# Altium integrated library WCAP-ATG8_rev15a.intlib: 195 symbols (part 2 of 2) (continued)
## WCAP-ATG8 16x25x7.5x0.8 860010780022
designator C?, comment 680 μF
WCAP-ATG8 Aluminum Electrolytic Capacitors , 680 μF; + / - 20%; 63 V , 16 x 25; Manufacturer: Wurth Elektronik; partNo: 860010780022; E-mail: libraries@we-online.com; Characteristics: Aluminum Electrolytic Capacitor; Recommended soldering: Wave; Operating temperature:–40 °C to +85 °C for UR < 400 V; 25 °C to +85 °C for UR ≥ 400 V; Wide capacitance value range; Load life: 2000 h @ +85 °C; ComponentLink1Description: Manufacturer; ComponentLink1URL: http://www.we-online.com; ComponentLink2Description: Datasheet; ComponentLink2URL: http://katalog.we-online.de/pbs/datasheet/860010780022.pdf; Created by: Karrer Zheng; Created Date: 6/8/2015; Capacitance: 680 μF; Application: Medium and high voltage type range from 160V-450V used as primary side input filter in power supply; Low voltage type used as energy storage or low frequency filtering in circuit, applied to general switching power supply, AC-DC converter, adapter, charger, TV, VCR, DC motor circuit filter, digital audio, digital cameras, digital video cameras, satellite receiver etc.
footprint WCAP-ATG8 16x25x7.5x0.8
pins: 1, 2

## WCAP-ATG8 16x25x7.5x0.8 860010780023
designator C?, comment 820 μF
WCAP-ATG8 Aluminum Electrolytic Capacitors , 820 μF; + / - 20%; 63 V , 16 x 25; Manufacturer: Wurth Elektronik; partNo: 860010780023; E-mail: libraries@we-online.com; Characteristics: Aluminum Electrolytic Capacitor; Recommended soldering: Wave; Operating temperature:–40 °C to +85 °C for UR < 400 V; 25 °C to +85 °C for UR ≥ 400 V; Wide capacitance value range; Load life: 2000 h @ +85 °C; ComponentLink1Description: Manufacturer; ComponentLink1URL: http://www.we-online.com; ComponentLink2Description: Datasheet; ComponentLink2URL: http://katalog.we-online.de/pbs/datasheet/860010780023.pdf; Created by: Karrer Zheng; Created Date: 6/8/2015; Capacitance: 820 μF; Application: Medium and high voltage type range from 160V-450V used as primary side input filter in power supply; Low voltage type used as energy storage or low frequency filtering in circuit, applied to general switching power supply, AC-DC converter, adapter, charger, TV, VCR, DC motor circuit filter, digital audio, digital cameras, digital video cameras, satellite receiver etc.
footprint WCAP-ATG8 16x25x7.5x0.8
pins: 1, 2

## WCAP-ATG8 16x25x7.5x0.8 860010780024
designator C?, comment 1000 μF
WCAP-ATG8 Aluminum Electrolytic Capacitors , 1000 μF; + / - 20%; 63 V , 16 x 25; Manufacturer: Wurth Elektronik; partNo: 860010780024; E-mail: libraries@we-online.com; Characteristics: Aluminum Electrolytic Capacitor; Recommended soldering: Wave; Operating temperature:–40 °C to +85 °C for UR < 400 V; 25 °C to +85 °C for UR ≥ 400 V; Wide capacitance value range; Load life: 2000 h @ +85 °C; ComponentLink1Description: Manufacturer; ComponentLink1URL: http://www.we-online.com; ComponentLink2Description: Datasheet; ComponentLink2URL: http://katalog.we-online.de/pbs/datasheet/860010780024.pdf; Created by: Karrer Zheng; Created Date: 6/8/2015; Capacitance: 1000 μF; Application: Medium and high voltage type range from 160V-450V used as primary side input filter in power supply; Low voltage type used as energy storage or low frequency filtering in circuit, applied to general switching power supply, AC-DC converter, adapter, charger, TV, VCR, DC motor circuit filter, digital audio, digital cameras, digital video cameras, satellite receiver etc.
footprint WCAP-ATG8 16x25x7.5x0.8
pins: 1, 2

## WCAP-ATG8 16x31.5x7.5x0.8 860010780025
designator C?, comment 1200 μF
WCAP-ATG8 Aluminum Electrolytic Capacitors , 1200 μF; + / - 20%; 63 V , 16 x 31,5; Manufacturer: Wurth Elektronik; partNo: 860010780025; E-mail: libraries@we-online.com; Characteristics: Aluminum Electrolytic Capacitor; Recommended soldering: Wave; Operating temperature:–40 °C to +85 °C for UR < 400 V; 25 °C to +85 °C for UR ≥ 400 V; Wide capacitance value range; Load life: 2000 h @ +85 °C; ComponentLink1Description: Manufacturer; ComponentLink1URL: http://www.we-online.com; ComponentLink2Description: Datasheet; ComponentLink2URL: http://katalog.we-online.de/pbs/datasheet/860010780025.pdf; Created by: Karrer Zheng; Created Date: 6/8/2015; Capacitance: 1200 μF; Application: Medium and high voltage type range from 160V-450V used as primary side input filter in power supply; Low voltage type used as energy storage or low frequency filtering in circuit, applied to general switching power supply, AC-DC converter, adapter, charger, TV, VCR, DC motor circuit filter, digital audio, digital cameras, digital video cameras, satellite receiver etc.
footprint WCAP-ATG8 16x31.5x7.5x0.8
pins: 1, 2

## WCAP-ATG8 16x35.5x7.5x0.8 860010780026
designator C?, comment 1500 μF
WCAP-ATG8 Aluminum Electrolytic Capacitors , 1500 μF; + / - 20%; 63 V , 16 x 35,5; Manufacturer: Wurth Elektronik; partNo: 860010780026; E-mail: libraries@we-online.com; Characteristics: Aluminum Electrolytic Capacitor; Recommended soldering: Wave; Operating temperature:–40 °C to +85 °C for UR < 400 V; 25 °C to +85 °C for UR ≥ 400 V; Wide capacitance value range; Load life: 2000 h @ +85 °C; ComponentLink1Description: Manufacturer; ComponentLink1URL: http://www.we-online.com; ComponentLink2Description: Datasheet; ComponentLink2URL: http://katalog.we-online.de/pbs/datasheet/860010780026.pdf; Created by: Karrer Zheng; Created Date: 6/8/2015; Capacitance: 1500 μF; Application: Medium and high voltage type range from 160V-450V used as primary side input filter in power supply; Low voltage type used as energy storage or low frequency filtering in circuit, applied to general switching power supply, AC-DC converter, adapter, charger, TV, VCR, DC motor circuit filter, digital audio, digital cameras, digital video cameras, satellite receiver etc.
footprint WCAP-ATG8 16x35.5x7.5x0.8
pins: 1, 2

## WCAP-ATG8 16x35.5x7.5x0.8 860010780027
designator C?, comment 1800 μF
WCAP-ATG8 Aluminum Electrolytic Capacitors , 1800 μF; + / - 20%; 63 V , 16 x 35,5; Manufacturer: Wurth Elektronik; partNo: 860010780027; E-mail: libraries@we-online.com; Characteristics: Aluminum Electrolytic Capacitor; Recommended soldering: Wave; Operating temperature:–40 °C to +85 °C for UR < 400 V; 25 °C to +85 °C for UR ≥ 400 V; Wide capacitance value range; Load life: 2000 h @ +85 °C; ComponentLink1Description: Manufacturer; ComponentLink1URL: http://www.we-online.com; ComponentLink2Description: Datasheet; ComponentLink2URL: http://katalog.we-online.de/pbs/datasheet/860010780027.pdf; Created by: Karrer Zheng; Created Date: 6/8/2015; Capacitance: 1800 μF; Application: Medium and high voltage type range from 160V-450V used as primary side input filter in power supply; Low voltage type used as energy storage or low frequency filtering in circuit, applied to general switching power supply, AC-DC converter, adapter, charger, TV, VCR, DC motor circuit filter, digital audio, digital cameras, digital video cameras, satellite receiver etc.
footprint WCAP-ATG8 16x35.5x7.5x0.8
pins: 1, 2

## WCAP-ATG8 18x35.5x7.5x0.8 860010781028
designator C?, comment 2200 μF
WCAP-ATG8 Aluminum Electrolytic Capacitors , 2200 μF; + / - 20%; 63 V , 18 x 35,5; Manufacturer: Wurth Elektronik; partNo: 860010781028; E-mail: libraries@we-online.com; Characteristics: Aluminum Electrolytic Capacitor; Recommended soldering: Wave; Operating temperature:–40 °C to +85 °C for UR < 400 V; 25 °C to +85 °C for UR ≥ 400 V; Wide capacitance value range; Load life: 2000 h @ +85 °C; ComponentLink1Description: Manufacturer; ComponentLink1URL: http://www.we-online.com; ComponentLink2Description: Datasheet; ComponentLink2URL: http://katalog.we-online.de/pbs/datasheet/860010781028.pdf; Created by: Karrer Zheng; Created Date: 6/8/2015; Capacitance: 2200 μF; Application: Medium and high voltage type range from 160V-450V used as primary side input filter in power supply; Low voltage type used as energy storage or low frequency filtering in circuit, applied to general switching power supply, AC-DC converter, adapter, charger, TV, VCR, DC motor circuit filter, digital audio, digital cameras, digital video cameras, satellite receiver etc.
footprint WCAP-ATG8 18x35.5x7.5x0.8
pins: 1, 2

## WCAP-ATG8 22x41x10x0.8 860010783029
designator C?, comment 2700 μF
WCAP-ATG8 Aluminum Electrolytic Capacitors , 2700 μF; + / - 20%; 63 V , 22 x 41; Manufacturer: Wurth Elektronik; partNo: 860010783029; E-mail: libraries@we-online.com; Characteristics: Aluminum Electrolytic Capacitor; Recommended soldering: Wave; Operating temperature:–40 °C to +85 °C for UR < 400 V; 25 °C to +85 °C for UR ≥ 400 V; Wide capacitance value range; Load life: 2000 h @ +85 °C; ComponentLink1Description: Manufacturer; ComponentLink1URL: http://www.we-online.com; ComponentLink2Description: Datasheet; ComponentLink2URL: http://katalog.we-online.de/pbs/datasheet/860010783029.pdf; Created by: Karrer Zheng; Created Date: 6/8/2015; Capacitance: 2700 μF; Application: Medium and high voltage type range from 160V-450V used as primary side input filter in power supply; Low voltage type used as energy storage or low frequency filtering in circuit, applied to general switching power supply, AC-DC converter, adapter, charger, TV, VCR, DC motor circuit filter, digital audio, digital cameras, digital video cameras, satellite receiver etc.
footprint WCAP-ATG8 22x41x10x0.8
pins: 1, 2

## WCAP-ATG8 22x41x10x0.8 860010783030
designator C?, comment 3300 μF
WCAP-ATG8 Aluminum Electrolytic Capacitors , 3300 μF; + / - 20%; 63 V , 22 x 41; Manufacturer: Wurth Elektronik; partNo: 860010783030; E-mail: libraries@we-online.com; Characteristics: Aluminum Electrolytic Capacitor; Recommended soldering: Wave; Operating temperature:–40 °C to +85 °C for UR < 400 V; 25 °C to +85 °C for UR ≥ 400 V; Wide capacitance value range; Load life: 2000 h @ +85 °C; ComponentLink1Description: Manufacturer; ComponentLink1URL: http://www.we-online.com; ComponentLink2Description: Datasheet; ComponentLink2URL: http://katalog.we-online.de/pbs/datasheet/860010783030.pdf; Created by: Karrer Zheng; Created Date: 6/8/2015; Capacitance: 3300 μF; Application: Medium and high voltage type range from 160V-450V used as primary side input filter in power supply; Low voltage type used as energy storage or low frequency filtering in circuit, applied to general switching power supply, AC-DC converter, adapter, charger, TV, VCR, DC motor circuit filter, digital audio, digital cameras, digital video cameras, satellite receiver etc.
footprint WCAP-ATG8 22x41x10x0.8
pins: 1, 2


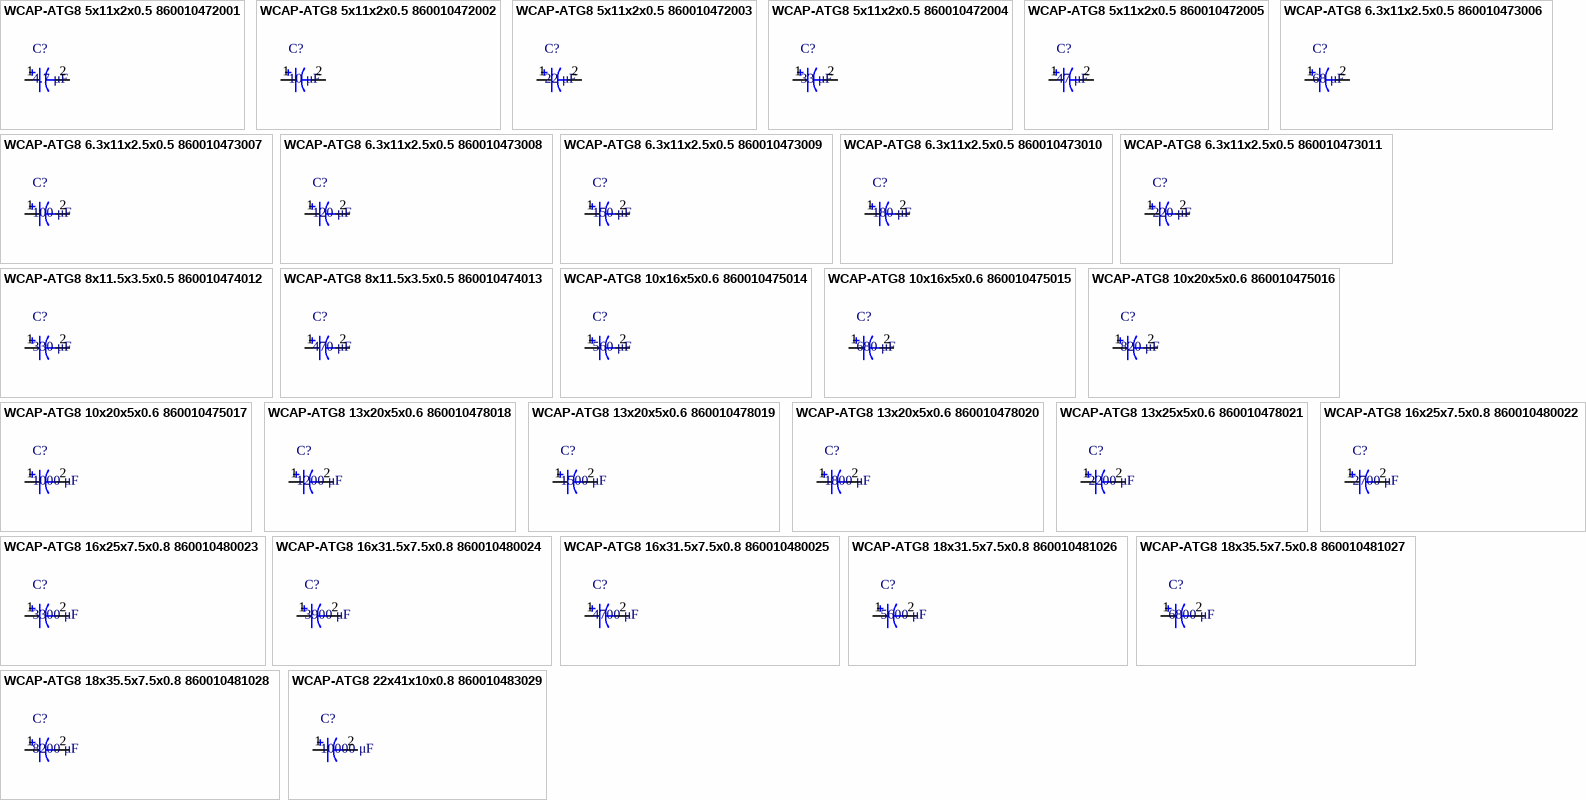
[diagram p5: symbols WCAP-ATG8 5x11x2x0.5 860010472001 to WCAP-ATG8 22x41x10x0.8 860010483029]

## WCAP-ATG8 5x11x2x0.5 860010472001
designator C?, comment 4.7 μF
WCAP-ATG8 Aluminum Electrolytic Capacitors , 4,7 μF; + / - 20%; 25 V , 5 x 11; Manufacturer: Wurth Elektronik; partNo: 860010472001; E-mail: libraries@we-online.com; Characteristics: Aluminum Electrolytic Capacitor; Recommended soldering: Wave; Operating temperature:–40 °C to +85 °C for UR < 400 V; 25 °C to +85 °C for UR ≥ 400 V; Wide capacitance value range; Load life: 2000 h @ +85 °C; ComponentLink1Description: Manufacturer; ComponentLink1URL: http://www.we-online.com; ComponentLink2Description: Datasheet; ComponentLink2URL: http://katalog.we-online.de/pbs/datasheet/860010472001.pdf; Created by: Karrer Zheng; Created Date: 6/8/2015; Capacitance: 4.7 μF; Application: Medium and high voltage type range from 160V-450V used as primary side input filter in power supply; Low voltage type used as energy storage or low frequency filtering in circuit, applied to general switching power supply, AC-DC converter, adapter, charger, TV, VCR, DC motor circuit filter, digital audio, digital cameras, digital video cameras, satellite receiver etc.
footprint WCAP-ATG8 5x11x2x0.5
pins: 1, 2

## WCAP-ATG8 5x11x2x0.5 860010472002
designator C?, comment 10 μF
WCAP-ATG8 Aluminum Electrolytic Capacitors , 10 μF; + / - 20%; 25 V , 5 x 11; Manufacturer: Wurth Elektronik; partNo: 860010472002; E-mail: libraries@we-online.com; Characteristics: Aluminum Electrolytic Capacitor; Recommended soldering: Wave; Operating temperature:–40 °C to +85 °C for UR < 400 V; 25 °C to +85 °C for UR ≥ 400 V; Wide capacitance value range; Load life: 2000 h @ +85 °C; ComponentLink1Description: Manufacturer; ComponentLink1URL: http://www.we-online.com; ComponentLink2Description: Datasheet; ComponentLink2URL: http://katalog.we-online.de/pbs/datasheet/860010472002.pdf; Created by: Karrer Zheng; Created Date: 6/8/2015; Capacitance: 10 μF; Application: Medium and high voltage type range from 160V-450V used as primary side input filter in power supply; Low voltage type used as energy storage or low frequency filtering in circuit, applied to general switching power supply, AC-DC converter, adapter, charger, TV, VCR, DC motor circuit filter, digital audio, digital cameras, digital video cameras, satellite receiver etc.
footprint WCAP-ATG8 5x11x2x0.5
pins: 1, 2

## WCAP-ATG8 5x11x2x0.5 860010472003
designator C?, comment 22 μF
WCAP-ATG8 Aluminum Electrolytic Capacitors , 22 μF; + / - 20%; 25 V , 5 x 11; Manufacturer: Wurth Elektronik; partNo: 860010472003; E-mail: libraries@we-online.com; Characteristics: Aluminum Electrolytic Capacitor; Recommended soldering: Wave; Operating temperature:–40 °C to +85 °C for UR < 400 V; 25 °C to +85 °C for UR ≥ 400 V; Wide capacitance value range; Load life: 2000 h @ +85 °C; ComponentLink1Description: Manufacturer; ComponentLink1URL: http://www.we-online.com; ComponentLink2Description: Datasheet; ComponentLink2URL: http://katalog.we-online.de/pbs/datasheet/860010472003.pdf; Created by: Karrer Zheng; Created Date: 6/8/2015; Capacitance: 22 μF; Application: Medium and high voltage type range from 160V-450V used as primary side input filter in power supply; Low voltage type used as energy storage or low frequency filtering in circuit, applied to general switching power supply, AC-DC converter, adapter, charger, TV, VCR, DC motor circuit filter, digital audio, digital cameras, digital video cameras, satellite receiver etc.
footprint WCAP-ATG8 5x11x2x0.5
pins: 1, 2

## WCAP-ATG8 5x11x2x0.5 860010472004
designator C?, comment 33 μF
WCAP-ATG8 Aluminum Electrolytic Capacitors , 33 μF; + / - 20%; 25 V , 5 x 11; Manufacturer: Wurth Elektronik; partNo: 860010472004; E-mail: libraries@we-online.com; Characteristics: Aluminum Electrolytic Capacitor; Recommended soldering: Wave; Operating temperature:–40 °C to +85 °C for UR < 400 V; 25 °C to +85 °C for UR ≥ 400 V; Wide capacitance value range; Load life: 2000 h @ +85 °C; ComponentLink1Description: Manufacturer; ComponentLink1URL: http://www.we-online.com; ComponentLink2Description: Datasheet; ComponentLink2URL: http://katalog.we-online.de/pbs/datasheet/860010472004.pdf; Created by: Karrer Zheng; Created Date: 6/8/2015; Capacitance: 33 μF; Application: Medium and high voltage type range from 160V-450V used as primary side input filter in power supply; Low voltage type used as energy storage or low frequency filtering in circuit, applied to general switching power supply, AC-DC converter, adapter, charger, TV, VCR, DC motor circuit filter, digital audio, digital cameras, digital video cameras, satellite receiver etc.
footprint WCAP-ATG8 5x11x2x0.5
pins: 1, 2

## WCAP-ATG8 5x11x2x0.5 860010472005
designator C?, comment 47 μF
WCAP-ATG8 Aluminum Electrolytic Capacitors , 47 μF; + / - 20%; 25 V , 5 x 11; Manufacturer: Wurth Elektronik; partNo: 860010472005; E-mail: libraries@we-online.com; Characteristics: Aluminum Electrolytic Capacitor; Recommended soldering: Wave; Operating temperature:–40 °C to +85 °C for UR < 400 V; 25 °C to +85 °C for UR ≥ 400 V; Wide capacitance value range; Load life: 2000 h @ +85 °C; ComponentLink1Description: Manufacturer; ComponentLink1URL: http://www.we-online.com; ComponentLink2Description: Datasheet; ComponentLink2URL: http://katalog.we-online.de/pbs/datasheet/860010472005.pdf; Created by: Karrer Zheng; Created Date: 6/8/2015; Capacitance: 47 μF; Application: Medium and high voltage type range from 160V-450V used as primary side input filter in power supply; Low voltage type used as energy storage or low frequency filtering in circuit, applied to general switching power supply, AC-DC converter, adapter, charger, TV, VCR, DC motor circuit filter, digital audio, digital cameras, digital video cameras, satellite receiver etc.
footprint WCAP-ATG8 5x11x2x0.5
pins: 1, 2

## WCAP-ATG8 6.3x11x2.5x0.5 860010473006
designator C?, comment 68 μF
WCAP-ATG8 Aluminum Electrolytic Capacitors , 68 μF; + / - 20%; 25 V , 6,3 x 11; Manufacturer: Wurth Elektronik; partNo: 860010473006; E-mail: libraries@we-online.com; Characteristics: Aluminum Electrolytic Capacitor; Recommended soldering: Wave; Operating temperature:–40 °C to +85 °C for UR < 400 V; 25 °C to +85 °C for UR ≥ 400 V; Wide capacitance value range; Load life: 2000 h @ +85 °C; ComponentLink1Description: Manufacturer; ComponentLink1URL: http://www.we-online.com; ComponentLink2Description: Datasheet; ComponentLink2URL: http://katalog.we-online.de/pbs/datasheet/860010473006.pdf; Created by: Karrer Zheng; Created Date: 6/8/2015; Capacitance: 68 μF; Application: Medium and high voltage type range from 160V-450V used as primary side input filter in power supply; Low voltage type used as energy storage or low frequency filtering in circuit, applied to general switching power supply, AC-DC converter, adapter, charger, TV, VCR, DC motor circuit filter, digital audio, digital cameras, digital video cameras, satellite receiver etc.
footprint WCAP-ATG8 6.3x11x2.5x0.5
pins: 1, 2

## WCAP-ATG8 6.3x11x2.5x0.5 860010473007
designator C?, comment 100 μF
WCAP-ATG8 Aluminum Electrolytic Capacitors , 100 μF; + / - 20%; 25 V , 6,3 x 11; Manufacturer: Wurth Elektronik; partNo: 860010473007; E-mail: libraries@we-online.com; Characteristics: Aluminum Electrolytic Capacitor; Recommended soldering: Wave; Operating temperature:–40 °C to +85 °C for UR < 400 V; 25 °C to +85 °C for UR ≥ 400 V; Wide capacitance value range; Load life: 2000 h @ +85 °C; ComponentLink1Description: Manufacturer; ComponentLink1URL: http://www.we-online.com; ComponentLink2Description: Datasheet; ComponentLink2URL: http://katalog.we-online.de/pbs/datasheet/860010473007.pdf; Created by: Karrer Zheng; Created Date: 6/8/2015; Capacitance: 100 μF; Application: Medium and high voltage type range from 160V-450V used as primary side input filter in power supply; Low voltage type used as energy storage or low frequency filtering in circuit, applied to general switching power supply, AC-DC converter, adapter, charger, TV, VCR, DC motor circuit filter, digital audio, digital cameras, digital video cameras, satellite receiver etc.
footprint WCAP-ATG8 6.3x11x2.5x0.5
pins: 1, 2

## WCAP-ATG8 6.3x11x2.5x0.5 860010473008
designator C?, comment 120 μF
WCAP-ATG8 Aluminum Electrolytic Capacitors , 120 μF; + / - 20%; 25 V , 6,3 x 11; Manufacturer: Wurth Elektronik; partNo: 860010473008; E-mail: libraries@we-online.com; Characteristics: Aluminum Electrolytic Capacitor; Recommended soldering: Wave; Operating temperature:–40 °C to +85 °C for UR < 400 V; 25 °C to +85 °C for UR ≥ 400 V; Wide capacitance value range; Load life: 2000 h @ +85 °C; ComponentLink1Description: Manufacturer; ComponentLink1URL: http://www.we-online.com; ComponentLink2Description: Datasheet; ComponentLink2URL: http://katalog.we-online.de/pbs/datasheet/860010473008.pdf; Created by: Karrer Zheng; Created Date: 6/8/2015; Capacitance: 120 μF; Application: Medium and high voltage type range from 160V-450V used as primary side input filter in power supply; Low voltage type used as energy storage or low frequency filtering in circuit, applied to general switching power supply, AC-DC converter, adapter, charger, TV, VCR, DC motor circuit filter, digital audio, digital cameras, digital video cameras, satellite receiver etc.
footprint WCAP-ATG8 6.3x11x2.5x0.5
pins: 1, 2

## WCAP-ATG8 6.3x11x2.5x0.5 860010473009
designator C?, comment 150 μF
WCAP-ATG8 Aluminum Electrolytic Capacitors , 150 μF; + / - 20%; 25 V , 6,3 x 11; Manufacturer: Wurth Elektronik; partNo: 860010473009; E-mail: libraries@we-online.com; Characteristics: Aluminum Electrolytic Capacitor; Recommended soldering: Wave; Operating temperature:–40 °C to +85 °C for UR < 400 V; 25 °C to +85 °C for UR ≥ 400 V; Wide capacitance value range; Load life: 2000 h @ +85 °C; ComponentLink1Description: Manufacturer; ComponentLink1URL: http://www.we-online.com; ComponentLink2Description: Datasheet; ComponentLink2URL: http://katalog.we-online.de/pbs/datasheet/860010473009.pdf; Created by: Karrer Zheng; Created Date: 6/8/2015; Capacitance: 150 μF; Application: Medium and high voltage type range from 160V-450V used as primary side input filter in power supply; Low voltage type used as energy storage or low frequency filtering in circuit, applied to general switching power supply, AC-DC converter, adapter, charger, TV, VCR, DC motor circuit filter, digital audio, digital cameras, digital video cameras, satellite receiver etc.
footprint WCAP-ATG8 6.3x11x2.5x0.5
pins: 1, 2

## WCAP-ATG8 6.3x11x2.5x0.5 860010473010
designator C?, comment 180 μF
WCAP-ATG8 Aluminum Electrolytic Capacitors , 180 μF; + / - 20%; 25 V , 6,3 x 11; Manufacturer: Wurth Elektronik; partNo: 860010473010; E-mail: libraries@we-online.com; Characteristics: Aluminum Electrolytic Capacitor; Recommended soldering: Wave; Operating temperature:–40 °C to +85 °C for UR < 400 V; 25 °C to +85 °C for UR ≥ 400 V; Wide capacitance value range; Load life: 2000 h @ +85 °C; ComponentLink1Description: Manufacturer; ComponentLink1URL: http://www.we-online.com; ComponentLink2Description: Datasheet; ComponentLink2URL: http://katalog.we-online.de/pbs/datasheet/860010473010.pdf; Created by: Karrer Zheng; Created Date: 6/8/2015; Capacitance: 180 μF; Application: Medium and high voltage type range from 160V-450V used as primary side input filter in power supply; Low voltage type used as energy storage or low frequency filtering in circuit, applied to general switching power supply, AC-DC converter, adapter, charger, TV, VCR, DC motor circuit filter, digital audio, digital cameras, digital video cameras, satellite receiver etc.
footprint WCAP-ATG8 6.3x11x2.5x0.5
pins: 1, 2

## WCAP-ATG8 6.3x11x2.5x0.5 860010473011
designator C?, comment 220 μF
WCAP-ATG8 Aluminum Electrolytic Capacitors , 220 μF; + / - 20%; 25 V , 6,3 x 11; Manufacturer: Wurth Elektronik; partNo: 860010473011; E-mail: libraries@we-online.com; Characteristics: Aluminum Electrolytic Capacitor; Recommended soldering: Wave; Operating temperature:–40 °C to +85 °C for UR < 400 V; 25 °C to +85 °C for UR ≥ 400 V; Wide capacitance value range; Load life: 2000 h @ +85 °C; ComponentLink1Description: Manufacturer; ComponentLink1URL: http://www.we-online.com; ComponentLink2Description: Datasheet; ComponentLink2URL: http://katalog.we-online.de/pbs/datasheet/860010473011.pdf; Created by: Karrer Zheng; Created Date: 6/8/2015; Capacitance: 220 μF; Application: Medium and high voltage type range from 160V-450V used as primary side input filter in power supply; Low voltage type used as energy storage or low frequency filtering in circuit, applied to general switching power supply, AC-DC converter, adapter, charger, TV, VCR, DC motor circuit filter, digital audio, digital cameras, digital video cameras, satellite receiver etc.
footprint WCAP-ATG8 6.3x11x2.5x0.5
pins: 1, 2

## WCAP-ATG8 8x11.5x3.5x0.5 860010474012
designator C?, comment 330 μF
WCAP-ATG8 Aluminum Electrolytic Capacitors , 330 μF; + / - 20%; 25 V , 8 x 11,5; Manufacturer: Wurth Elektronik; partNo: 860010474012; E-mail: libraries@we-online.com; Characteristics: Aluminum Electrolytic Capacitor; Recommended soldering: Wave; Operating temperature:–40 °C to +85 °C for UR < 400 V; 25 °C to +85 °C for UR ≥ 400 V; Wide capacitance value range; Load life: 2000 h @ +85 °C; ComponentLink1Description: Manufacturer; ComponentLink1URL: http://www.we-online.com; ComponentLink2Description: Datasheet; ComponentLink2URL: http://katalog.we-online.de/pbs/datasheet/860010474012.pdf; Created by: Karrer Zheng; Created Date: 6/8/2015; Capacitance: 330 μF; Application: Medium and high voltage type range from 160V-450V used as primary side input filter in power supply; Low voltage type used as energy storage or low frequency filtering in circuit, applied to general switching power supply, AC-DC converter, adapter, charger, TV, VCR, DC motor circuit filter, digital audio, digital cameras, digital video cameras, satellite receiver etc.
footprint WCAP-ATG8 8x11.5x3.5x0.5
pins: 1, 2

## WCAP-ATG8 8x11.5x3.5x0.5 860010474013
designator C?, comment 470 μF
WCAP-ATG8 Aluminum Electrolytic Capacitors , 470 μF; + / - 20%; 25 V , 8 x 11,5; Manufacturer: Wurth Elektronik; partNo: 860010474013; E-mail: libraries@we-online.com; Characteristics: Aluminum Electrolytic Capacitor; Recommended soldering: Wave; Operating temperature:–40 °C to +85 °C for UR < 400 V; 25 °C to +85 °C for UR ≥ 400 V; Wide capacitance value range; Load life: 2000 h @ +85 °C; ComponentLink1Description: Manufacturer; ComponentLink1URL: http://www.we-online.com; ComponentLink2Description: Datasheet; ComponentLink2URL: http://katalog.we-online.de/pbs/datasheet/860010474013.pdf; Created by: Karrer Zheng; Created Date: 6/8/2015; Capacitance: 470 μF; Application: Medium and high voltage type range from 160V-450V used as primary side input filter in power supply; Low voltage type used as energy storage or low frequency filtering in circuit, applied to general switching power supply, AC-DC converter, adapter, charger, TV, VCR, DC motor circuit filter, digital audio, digital cameras, digital video cameras, satellite receiver etc.
footprint WCAP-ATG8 8x11.5x3.5x0.5
pins: 1, 2

## WCAP-ATG8 10x16x5x0.6 860010475014
designator C?, comment 560 μF
WCAP-ATG8 Aluminum Electrolytic Capacitors , 560 μF; + / - 20%; 25 V , 10 x 16; Manufacturer: Wurth Elektronik; partNo: 860010475014; E-mail: libraries@we-online.com; Characteristics: Aluminum Electrolytic Capacitor; Recommended soldering: Wave; Operating temperature:–40 °C to +85 °C for UR < 400 V; 25 °C to +85 °C for UR ≥ 400 V; Wide capacitance value range; Load life: 2000 h @ +85 °C; ComponentLink1Description: Manufacturer; ComponentLink1URL: http://www.we-online.com; ComponentLink2Description: Datasheet; ComponentLink2URL: http://katalog.we-online.de/pbs/datasheet/860010475014.pdf; Created by: Karrer Zheng; Created Date: 6/8/2015; Capacitance: 560 μF; Application: Medium and high voltage type range from 160V-450V used as primary side input filter in power supply; Low voltage type used as energy storage or low frequency filtering in circuit, applied to general switching power supply, AC-DC converter, adapter, charger, TV, VCR, DC motor circuit filter, digital audio, digital cameras, digital video cameras, satellite receiver etc.
footprint WCAP-ATG8 10x16x5x0.6
pins: 1, 2

## WCAP-ATG8 10x16x5x0.6 860010475015
designator C?, comment 680 μF
WCAP-ATG8 Aluminum Electrolytic Capacitors , 680 μF; + / - 20%; 25 V , 10 x 16; Manufacturer: Wurth Elektronik; partNo: 860010475015; E-mail: libraries@we-online.com; Characteristics: Aluminum Electrolytic Capacitor; Recommended soldering: Wave; Operating temperature:–40 °C to +85 °C for UR < 400 V; 25 °C to +85 °C for UR ≥ 400 V; Wide capacitance value range; Load life: 2000 h @ +85 °C; ComponentLink1Description: Manufacturer; ComponentLink1URL: http://www.we-online.com; ComponentLink2Description: Datasheet; ComponentLink2URL: http://katalog.we-online.de/pbs/datasheet/860010475015.pdf; Created by: Karrer Zheng; Created Date: 6/8/2015; Capacitance: 680 μF; Application: Medium and high voltage type range from 160V-450V used as primary side input filter in power supply; Low voltage type used as energy storage or low frequency filtering in circuit, applied to general switching power supply, AC-DC converter, adapter, charger, TV, VCR, DC motor circuit filter, digital audio, digital cameras, digital video cameras, satellite receiver etc.
footprint WCAP-ATG8 10x16x5x0.6
pins: 1, 2

## WCAP-ATG8 10x20x5x0.6 860010475016
designator C?, comment 820 μF
WCAP-ATG8 Aluminum Electrolytic Capacitors , 820 μF; + / - 20%; 25 V , 10 x 20; Manufacturer: Wurth Elektronik; partNo: 860010475016; E-mail: libraries@we-online.com; Characteristics: Aluminum Electrolytic Capacitor; Recommended soldering: Wave; Operating temperature:–40 °C to +85 °C for UR < 400 V; 25 °C to +85 °C for UR ≥ 400 V; Wide capacitance value range; Load life: 2000 h @ +85 °C; ComponentLink1Description: Manufacturer; ComponentLink1URL: http://www.we-online.com; ComponentLink2Description: Datasheet; ComponentLink2URL: http://katalog.we-online.de/pbs/datasheet/860010475016.pdf; Created by: Karrer Zheng; Created Date: 6/8/2015; Capacitance: 820 μF; Application: Medium and high voltage type range from 160V-450V used as primary side input filter in power supply; Low voltage type used as energy storage or low frequency filtering in circuit, applied to general switching power supply, AC-DC converter, adapter, charger, TV, VCR, DC motor circuit filter, digital audio, digital cameras, digital video cameras, satellite receiver etc.
footprint WCAP-ATG8 10x20x5x0.6
pins: 1, 2

## WCAP-ATG8 10x20x5x0.6 860010475017
designator C?, comment 1000 μF
WCAP-ATG8 Aluminum Electrolytic Capacitors , 1000 μF; + / - 20%; 25 V , 10 x 20; Manufacturer: Wurth Elektronik; partNo: 860010475017; E-mail: libraries@we-online.com; Characteristics: Aluminum Electrolytic Capacitor; Recommended soldering: Wave; Operating temperature:–40 °C to +85 °C for UR < 400 V; 25 °C to +85 °C for UR ≥ 400 V; Wide capacitance value range; Load life: 2000 h @ +85 °C; ComponentLink1Description: Manufacturer; ComponentLink1URL: http://www.we-online.com; ComponentLink2Description: Datasheet; ComponentLink2URL: http://katalog.we-online.de/pbs/datasheet/860010475017.pdf; Created by: Karrer Zheng; Created Date: 6/8/2015; Capacitance: 1000 μF; Application: Medium and high voltage type range from 160V-450V used as primary side input filter in power supply; Low voltage type used as energy storage or low frequency filtering in circuit, applied to general switching power supply, AC-DC converter, adapter, charger, TV, VCR, DC motor circuit filter, digital audio, digital cameras, digital video cameras, satellite receiver etc.
footprint WCAP-ATG8 10x20x5x0.6
pins: 1, 2

## WCAP-ATG8 13x20x5x0.6 860010478018
designator C?, comment 1200 μF
WCAP-ATG8 Aluminum Electrolytic Capacitors , 1200 μF; + / - 20%; 25 V , 13 x 20; Manufacturer: Wurth Elektronik; partNo: 860010478018; E-mail: libraries@we-online.com; Characteristics: Aluminum Electrolytic Capacitor; Recommended soldering: Wave; Operating temperature:–40 °C to +85 °C for UR < 400 V; 25 °C to +85 °C for UR ≥ 400 V; Wide capacitance value range; Load life: 2000 h @ +85 °C; ComponentLink1Description: Manufacturer; ComponentLink1URL: http://www.we-online.com; ComponentLink2Description: Datasheet; ComponentLink2URL: http://katalog.we-online.de/pbs/datasheet/860010478018.pdf; Created by: Karrer Zheng; Created Date: 6/8/2015; Capacitance: 1200 μF; Application: Medium and high voltage type range from 160V-450V used as primary side input filter in power supply; Low voltage type used as energy storage or low frequency filtering in circuit, applied to general switching power supply, AC-DC converter, adapter, charger, TV, VCR, DC motor circuit filter, digital audio, digital cameras, digital video cameras, satellite receiver etc.
footprint WCAP-ATG8 13x20x5x0.6
pins: 1, 2

## WCAP-ATG8 13x20x5x0.6 860010478019
designator C?, comment 1500 μF
WCAP-ATG8 Aluminum Electrolytic Capacitors , 1500 μF; + / - 20%; 25 V , 13 x 20; Manufacturer: Wurth Elektronik; partNo: 860010478019; E-mail: libraries@we-online.com; Characteristics: Aluminum Electrolytic Capacitor; Recommended soldering: Wave; Operating temperature:–40 °C to +85 °C for UR < 400 V; 25 °C to +85 °C for UR ≥ 400 V; Wide capacitance value range; Load life: 2000 h @ +85 °C; ComponentLink1Description: Manufacturer; ComponentLink1URL: http://www.we-online.com; ComponentLink2Description: Datasheet; ComponentLink2URL: http://katalog.we-online.de/pbs/datasheet/860010478019.pdf; Created by: Karrer Zheng; Created Date: 6/8/2015; Capacitance: 1500 μF; Application: Medium and high voltage type range from 160V-450V used as primary side input filter in power supply; Low voltage type used as energy storage or low frequency filtering in circuit, applied to general switching power supply, AC-DC converter, adapter, charger, TV, VCR, DC motor circuit filter, digital audio, digital cameras, digital video cameras, satellite receiver etc.
footprint WCAP-ATG8 13x20x5x0.6
pins: 1, 2

## WCAP-ATG8 13x20x5x0.6 860010478020
designator C?, comment 1800 μF
WCAP-ATG8 Aluminum Electrolytic Capacitors , 1800 μF; + / - 20%; 25 V , 13 x 20; Manufacturer: Wurth Elektronik; partNo: 860010478020; E-mail: libraries@we-online.com; Characteristics: Aluminum Electrolytic Capacitor; Recommended soldering: Wave; Operating temperature:–40 °C to +85 °C for UR < 400 V; 25 °C to +85 °C for UR ≥ 400 V; Wide capacitance value range; Load life: 2000 h @ +85 °C; ComponentLink1Description: Manufacturer; ComponentLink1URL: http://www.we-online.com; ComponentLink2Description: Datasheet; ComponentLink2URL: http://katalog.we-online.de/pbs/datasheet/860010478020.pdf; Created by: Karrer Zheng; Created Date: 6/8/2015; Capacitance: 1800 μF; Application: Medium and high voltage type range from 160V-450V used as primary side input filter in power supply; Low voltage type used as energy storage or low frequency filtering in circuit, applied to general switching power supply, AC-DC converter, adapter, charger, TV, VCR, DC motor circuit filter, digital audio, digital cameras, digital video cameras, satellite receiver etc.
footprint WCAP-ATG8 13x20x5x0.6
pins: 1, 2

## WCAP-ATG8 13x25x5x0.6 860010478021
designator C?, comment 2200 μF
WCAP-ATG8 Aluminum Electrolytic Capacitors , 2200 μF; + / - 20%; 25 V , 13 x 25; Manufacturer: Wurth Elektronik; partNo: 860010478021; E-mail: libraries@we-online.com; Characteristics: Aluminum Electrolytic Capacitor; Recommended soldering: Wave; Operating temperature:–40 °C to +85 °C for UR < 400 V; 25 °C to +85 °C for UR ≥ 400 V; Wide capacitance value range; Load life: 2000 h @ +85 °C; ComponentLink1Description: Manufacturer; ComponentLink1URL: http://www.we-online.com; ComponentLink2Description: Datasheet; ComponentLink2URL: http://katalog.we-online.de/pbs/datasheet/860010478021.pdf; Created by: Karrer Zheng; Created Date: 6/8/2015; Capacitance: 2200 μF; Application: Medium and high voltage type range from 160V-450V used as primary side input filter in power supply; Low voltage type used as energy storage or low frequency filtering in circuit, applied to general switching power supply, AC-DC converter, adapter, charger, TV, VCR, DC motor circuit filter, digital audio, digital cameras, digital video cameras, satellite receiver etc.
footprint WCAP-ATG8 13x25x5x0.6
pins: 1, 2

## WCAP-ATG8 16x25x7.5x0.8 860010480022
designator C?, comment 2700 μF
WCAP-ATG8 Aluminum Electrolytic Capacitors , 2700 μF; + / - 20%; 25 V , 16 x 25; Manufacturer: Wurth Elektronik; partNo: 860010480022; E-mail: libraries@we-online.com; Characteristics: Aluminum Electrolytic Capacitor; Recommended soldering: Wave; Operating temperature:–40 °C to +85 °C for UR < 400 V; 25 °C to +85 °C for UR ≥ 400 V; Wide capacitance value range; Load life: 2000 h @ +85 °C; ComponentLink1Description: Manufacturer; ComponentLink1URL: http://www.we-online.com; ComponentLink2Description: Datasheet; ComponentLink2URL: http://katalog.we-online.de/pbs/datasheet/860010480022.pdf; Created by: Karrer Zheng; Created Date: 6/8/2015; Capacitance: 2700 μF; Application: Medium and high voltage type range from 160V-450V used as primary side input filter in power supply; Low voltage type used as energy storage or low frequency filtering in circuit, applied to general switching power supply, AC-DC converter, adapter, charger, TV, VCR, DC motor circuit filter, digital audio, digital cameras, digital video cameras, satellite receiver etc.
footprint WCAP-ATG8 16x25x7.5x0.8
pins: 1, 2

## WCAP-ATG8 16x25x7.5x0.8 860010480023
designator C?, comment 3300 μF
WCAP-ATG8 Aluminum Electrolytic Capacitors , 3300 μF; + / - 20%; 25 V , 16 x 25; Manufacturer: Wurth Elektronik; partNo: 860010480023; E-mail: libraries@we-online.com; Characteristics: Aluminum Electrolytic Capacitor; Recommended soldering: Wave; Operating temperature:–40 °C to +85 °C for UR < 400 V; 25 °C to +85 °C for UR ≥ 400 V; Wide capacitance value range; Load life: 2000 h @ +85 °C; ComponentLink1Description: Manufacturer; ComponentLink1URL: http://www.we-online.com; ComponentLink2Description: Datasheet; ComponentLink2URL: http://katalog.we-online.de/pbs/datasheet/860010480023.pdf; Created by: Karrer Zheng; Created Date: 6/8/2015; Capacitance: 3300 μF; Application: Medium and high voltage type range from 160V-450V used as primary side input filter in power supply; Low voltage type used as energy storage or low frequency filtering in circuit, applied to general switching power supply, AC-DC converter, adapter, charger, TV, VCR, DC motor circuit filter, digital audio, digital cameras, digital video cameras, satellite receiver etc.
footprint WCAP-ATG8 16x25x7.5x0.8
pins: 1, 2

## WCAP-ATG8 16x31.5x7.5x0.8 860010480024
designator C?, comment 3900 μF
WCAP-ATG8 Aluminum Electrolytic Capacitors , 3900 μF; + / - 20%; 25 V , 16 x 31,5; Manufacturer: Wurth Elektronik; partNo: 860010480024; E-mail: libraries@we-online.com; Characteristics: Aluminum Electrolytic Capacitor; Recommended soldering: Wave; Operating temperature:–40 °C to +85 °C for UR < 400 V; 25 °C to +85 °C for UR ≥ 400 V; Wide capacitance value range; Load life: 2000 h @ +85 °C; ComponentLink1Description: Manufacturer; ComponentLink1URL: http://www.we-online.com; ComponentLink2Description: Datasheet; ComponentLink2URL: http://katalog.we-online.de/pbs/datasheet/860010480024.pdf; Created by: Karrer Zheng; Created Date: 6/8/2015; Capacitance: 3900 μF; Application: Medium and high voltage type range from 160V-450V used as primary side input filter in power supply; Low voltage type used as energy storage or low frequency filtering in circuit, applied to general switching power supply, AC-DC converter, adapter, charger, TV, VCR, DC motor circuit filter, digital audio, digital cameras, digital video cameras, satellite receiver etc.
footprint WCAP-ATG8 16x31.5x7.5x0.8
pins: 1, 2

## WCAP-ATG8 16x31.5x7.5x0.8 860010480025
designator C?, comment 4700 μF
WCAP-ATG8 Aluminum Electrolytic Capacitors , 4700 μF; + / - 20%; 25 V , 16 x 31,5; Manufacturer: Wurth Elektronik; partNo: 860010480025; E-mail: libraries@we-online.com; Characteristics: Aluminum Electrolytic Capacitor; Recommended soldering: Wave; Operating temperature:–40 °C to +85 °C for UR < 400 V; 25 °C to +85 °C for UR ≥ 400 V; Wide capacitance value range; Load life: 2000 h @ +85 °C; ComponentLink1Description: Manufacturer; ComponentLink1URL: http://www.we-online.com; ComponentLink2Description: Datasheet; ComponentLink2URL: http://katalog.we-online.de/pbs/datasheet/860010480025.pdf; Created by: Karrer Zheng; Created Date: 6/8/2015; Capacitance: 4700 μF; Application: Medium and high voltage type range from 160V-450V used as primary side input filter in power supply; Low voltage type used as energy storage or low frequency filtering in circuit, applied to general switching power supply, AC-DC converter, adapter, charger, TV, VCR, DC motor circuit filter, digital audio, digital cameras, digital video cameras, satellite receiver etc.
footprint WCAP-ATG8 16x31.5x7.5x0.8
pins: 1, 2

## WCAP-ATG8 18x31.5x7.5x0.8 860010481026
designator C?, comment 5600 μF
WCAP-ATG8 Aluminum Electrolytic Capacitors , 5600 μF; + / - 20%; 25 V , 18 x 31,5; Manufacturer: Wurth Elektronik; partNo: 860010481026; E-mail: libraries@we-online.com; Characteristics: Aluminum Electrolytic Capacitor; Recommended soldering: Wave; Operating temperature:–40 °C to +85 °C for UR < 400 V; 25 °C to +85 °C for UR ≥ 400 V; Wide capacitance value range; Load life: 2000 h @ +85 °C; ComponentLink1Description: Manufacturer; ComponentLink1URL: http://www.we-online.com; ComponentLink2Description: Datasheet; ComponentLink2URL: http://katalog.we-online.de/pbs/datasheet/860010481026.pdf; Created by: Karrer Zheng; Created Date: 6/8/2015; Capacitance: 5600 μF; Application: Medium and high voltage type range from 160V-450V used as primary side input filter in power supply; Low voltage type used as energy storage or low frequency filtering in circuit, applied to general switching power supply, AC-DC converter, adapter, charger, TV, VCR, DC motor circuit filter, digital audio, digital cameras, digital video cameras, satellite receiver etc.
footprint WCAP-ATG8 18x31.5x7.5x0.8
pins: 1, 2

## WCAP-ATG8 18x35.5x7.5x0.8 860010481027
designator C?, comment 6800 μF
WCAP-ATG8 Aluminum Electrolytic Capacitors , 6800 μF; + / - 20%; 25 V , 18 x 35,5; Manufacturer: Wurth Elektronik; partNo: 860010481027; E-mail: libraries@we-online.com; Characteristics: Aluminum Electrolytic Capacitor; Recommended soldering: Wave; Operating temperature:–40 °C to +85 °C for UR < 400 V; 25 °C to +85 °C for UR ≥ 400 V; Wide capacitance value range; Load life: 2000 h @ +85 °C; ComponentLink1Description: Manufacturer; ComponentLink1URL: http://www.we-online.com; ComponentLink2Description: Datasheet; ComponentLink2URL: http://katalog.we-online.de/pbs/datasheet/860010481027.pdf; Created by: Karrer Zheng; Created Date: 6/8/2015; Capacitance: 6800 μF; Application: Medium and high voltage type range from 160V-450V used as primary side input filter in power supply; Low voltage type used as energy storage or low frequency filtering in circuit, applied to general switching power supply, AC-DC converter, adapter, charger, TV, VCR, DC motor circuit filter, digital audio, digital cameras, digital video cameras, satellite receiver etc.
footprint WCAP-ATG8 18x35.5x7.5x0.8
pins: 1, 2

## WCAP-ATG8 18x35.5x7.5x0.8 860010481028
designator C?, comment 8200 μF
WCAP-ATG8 Aluminum Electrolytic Capacitors , 8200 μF; + / - 20%; 25 V , 18 x 35,5; Manufacturer: Wurth Elektronik; partNo: 860010481028; E-mail: libraries@we-online.com; Characteristics: Aluminum Electrolytic Capacitor; Recommended soldering: Wave; Operating temperature:–40 °C to +85 °C for UR < 400 V; 25 °C to +85 °C for UR ≥ 400 V; Wide capacitance value range; Load life: 2000 h @ +85 °C; ComponentLink1Description: Manufacturer; ComponentLink1URL: http://www.we-online.com; ComponentLink2Description: Datasheet; ComponentLink2URL: http://katalog.we-online.de/pbs/datasheet/860010481028.pdf; Created by: Karrer Zheng; Created Date: 6/8/2015; Capacitance: 8200 μF; Application: Medium and high voltage type range from 160V-450V used as primary side input filter in power supply; Low voltage type used as energy storage or low frequency filtering in circuit, applied to general switching power supply, AC-DC converter, adapter, charger, TV, VCR, DC motor circuit filter, digital audio, digital cameras, digital video cameras, satellite receiver etc.
footprint WCAP-ATG8 18x35.5x7.5x0.8
pins: 1, 2

## WCAP-ATG8 22x41x10x0.8 860010483029
designator C?, comment 10000 μF
WCAP-ATG8 Aluminum Electrolytic Capacitors , 10000 μF; + / - 20%; 25 V , 22 x 41; Manufacturer: Wurth Elektronik; partNo: 860010483029; E-mail: libraries@we-online.com; Characteristics: Aluminum Electrolytic Capacitor; Recommended soldering: Wave; Operating temperature:–40 °C to +85 °C for UR < 400 V; 25 °C to +85 °C for UR ≥ 400 V; Wide capacitance value range; Load life: 2000 h @ +85 °C; ComponentLink1Description: Manufacturer; ComponentLink1URL: http://www.we-online.com; ComponentLink2Description: Datasheet; ComponentLink2URL: http://katalog.we-online.de/pbs/datasheet/860010483029.pdf; Created by: Karrer Zheng; Created Date: 6/8/2015; Capacitance: 10000 μF; Application: Medium and high voltage type range from 160V-450V used as primary side input filter in power supply; Low voltage type used as energy storage or low frequency filtering in circuit, applied to general switching power supply, AC-DC converter, adapter, charger, TV, VCR, DC motor circuit filter, digital audio, digital cameras, digital video cameras, satellite receiver etc.
footprint WCAP-ATG8 22x41x10x0.8
pins: 1, 2


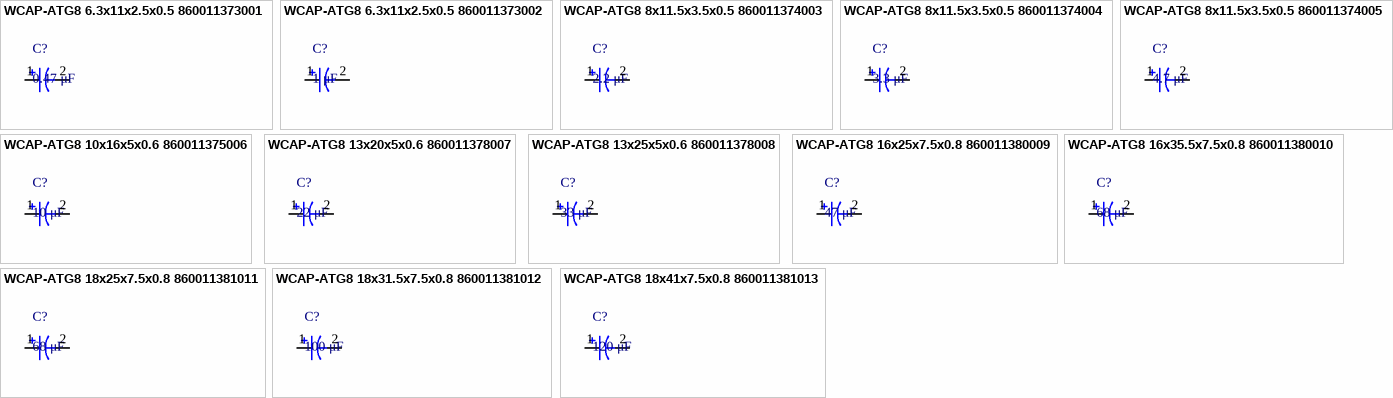
[diagram p6: symbols WCAP-ATG8 6.3x11x2.5x0.5 860011373001 to WCAP-ATG8 18x41x7.5x0.8 860011381013]

## WCAP-ATG8 6.3x11x2.5x0.5 860011373001
designator C?, comment 0.47 μF
WCAP-ATG8 Aluminum Electrolytic Capacitors , 0,47 μF; + / - 20%; 400 V , 6,3 x 11; Manufacturer: Wurth Elektronik; partNo: 860011373001; E-mail: libraries@we-online.com; Characteristics: Aluminum Electrolytic Capacitor; Recommended soldering: Wave; Operating temperature:–40 °C to +85 °C for UR < 400 V; 25 °C to +85 °C for UR ≥ 400 V; Wide capacitance value range; Load life: 2000 h @ +85 °C; ComponentLink1Description: Manufacturer; ComponentLink1URL: http://www.we-online.com; ComponentLink2Description: Datasheet; ComponentLink2URL: http://katalog.we-online.de/pbs/datasheet/860011373001.pdf; Created by: Karrer Zheng; Created Date: 6/8/2015; Capacitance: 0.47 μF; Application: Medium and high voltage type range from 160V-450V used as primary side input filter in power supply; Low voltage type used as energy storage or low frequency filtering in circuit, applied to general switching power supply, AC-DC converter, adapter, charger, TV, VCR, DC motor circuit filter, digital audio, digital cameras, digital video cameras, satellite receiver etc.
footprint WCAP-ATG8 6.3x11x2.5x0.5
pins: 1, 2

## WCAP-ATG8 6.3x11x2.5x0.5 860011373002
designator C?, comment 1 μF
WCAP-ATG8 Aluminum Electrolytic Capacitors , 1 μF; + / - 20%; 400 V , 6,3 x 11; Manufacturer: Wurth Elektronik; partNo: 860011373002; E-mail: libraries@we-online.com; Characteristics: Aluminum Electrolytic Capacitor; Recommended soldering: Wave; Operating temperature:–40 °C to +85 °C for UR < 400 V; 25 °C to +85 °C for UR ≥ 400 V; Wide capacitance value range; Load life: 2000 h @ +85 °C; ComponentLink1Description: Manufacturer; ComponentLink1URL: http://www.we-online.com; ComponentLink2Description: Datasheet; ComponentLink2URL: http://katalog.we-online.de/pbs/datasheet/860011373002.pdf; Created by: Karrer Zheng; Created Date: 6/8/2015; Capacitance: 1 μF; Application: Medium and high voltage type range from 160V-450V used as primary side input filter in power supply; Low voltage type used as energy storage or low frequency filtering in circuit, applied to general switching power supply, AC-DC converter, adapter, charger, TV, VCR, DC motor circuit filter, digital audio, digital cameras, digital video cameras, satellite receiver etc.
footprint WCAP-ATG8 6.3x11x2.5x0.5
pins: 1, 2

## WCAP-ATG8 8x11.5x3.5x0.5 860011374003
designator C?, comment 2.2 μF
WCAP-ATG8 Aluminum Electrolytic Capacitors , 2,2 μF; + / - 20%; 400 V , 8 x 11,5; Manufacturer: Wurth Elektronik; partNo: 860011374003; E-mail: libraries@we-online.com; Characteristics: Aluminum Electrolytic Capacitor; Recommended soldering: Wave; Operating temperature:–40 °C to +85 °C for UR < 400 V; 25 °C to +85 °C for UR ≥ 400 V; Wide capacitance value range; Load life: 2000 h @ +85 °C; ComponentLink1Description: Manufacturer; ComponentLink1URL: http://www.we-online.com; ComponentLink2Description: Datasheet; ComponentLink2URL: http://katalog.we-online.de/pbs/datasheet/860011374003.pdf; Created by: Karrer Zheng; Created Date: 6/8/2015; Capacitance: 2.2 μF; Application: Medium and high voltage type range from 160V-450V used as primary side input filter in power supply; Low voltage type used as energy storage or low frequency filtering in circuit, applied to general switching power supply, AC-DC converter, adapter, charger, TV, VCR, DC motor circuit filter, digital audio, digital cameras, digital video cameras, satellite receiver etc.
footprint WCAP-ATG8 8x11.5x3.5x0.5
pins: 1, 2

## WCAP-ATG8 8x11.5x3.5x0.5 860011374004
designator C?, comment 3.3 μF
WCAP-ATG8 Aluminum Electrolytic Capacitors , 3,3 μF; + / - 20%; 400 V , 8 x 11,5; Manufacturer: Wurth Elektronik; partNo: 860011374004; E-mail: libraries@we-online.com; Characteristics: Aluminum Electrolytic Capacitor; Recommended soldering: Wave; Operating temperature:–40 °C to +85 °C for UR < 400 V; 25 °C to +85 °C for UR ≥ 400 V; Wide capacitance value range; Load life: 2000 h @ +85 °C; ComponentLink1Description: Manufacturer; ComponentLink1URL: http://www.we-online.com; ComponentLink2Description: Datasheet; ComponentLink2URL: http://katalog.we-online.de/pbs/datasheet/860011374004.pdf; Created by: Karrer Zheng; Created Date: 6/8/2015; Capacitance: 3.3 μF; Application: Medium and high voltage type range from 160V-450V used as primary side input filter in power supply; Low voltage type used as energy storage or low frequency filtering in circuit, applied to general switching power supply, AC-DC converter, adapter, charger, TV, VCR, DC motor circuit filter, digital audio, digital cameras, digital video cameras, satellite receiver etc.
footprint WCAP-ATG8 8x11.5x3.5x0.5
pins: 1, 2

## WCAP-ATG8 8x11.5x3.5x0.5 860011374005
designator C?, comment 4.7 μF
WCAP-ATG8 Aluminum Electrolytic Capacitors , 4,7 μF; + / - 20%; 400 V , 8 x 11,5; Manufacturer: Wurth Elektronik; partNo: 860011374005; E-mail: libraries@we-online.com; Characteristics: Aluminum Electrolytic Capacitor; Recommended soldering: Wave; Operating temperature:–40 °C to +85 °C for UR < 400 V; 25 °C to +85 °C for UR ≥ 400 V; Wide capacitance value range; Load life: 2000 h @ +85 °C; ComponentLink1Description: Manufacturer; ComponentLink1URL: http://www.we-online.com; ComponentLink2Description: Datasheet; ComponentLink2URL: http://katalog.we-online.de/pbs/datasheet/860011374005.pdf; Created by: Karrer Zheng; Created Date: 6/8/2015; Capacitance: 4.7 μF; Application: Medium and high voltage type range from 160V-450V used as primary side input filter in power supply; Low voltage type used as energy storage or low frequency filtering in circuit, applied to general switching power supply, AC-DC converter, adapter, charger, TV, VCR, DC motor circuit filter, digital audio, digital cameras, digital video cameras, satellite receiver etc.
footprint WCAP-ATG8 8x11.5x3.5x0.5
pins: 1, 2

## WCAP-ATG8 10x16x5x0.6 860011375006
designator C?, comment 10 μF
WCAP-ATG8 Aluminum Electrolytic Capacitors , 10 μF; + / - 20%; 400 V , 10 x 16; Manufacturer: Wurth Elektronik; partNo: 860011375006; E-mail: libraries@we-online.com; Characteristics: Aluminum Electrolytic Capacitor; Recommended soldering: Wave; Operating temperature:–40 °C to +85 °C for UR < 400 V; 25 °C to +85 °C for UR ≥ 400 V; Wide capacitance value range; Load life: 2000 h @ +85 °C; ComponentLink1Description: Manufacturer; ComponentLink1URL: http://www.we-online.com; ComponentLink2Description: Datasheet; ComponentLink2URL: http://katalog.we-online.de/pbs/datasheet/860011375006.pdf; Created by: Karrer Zheng; Created Date: 6/8/2015; Capacitance: 10 μF; Application: Medium and high voltage type range from 160V-450V used as primary side input filter in power supply; Low voltage type used as energy storage or low frequency filtering in circuit, applied to general switching power supply, AC-DC converter, adapter, charger, TV, VCR, DC motor circuit filter, digital audio, digital cameras, digital video cameras, satellite receiver etc.
footprint WCAP-ATG8 10x16x5x0.6
pins: 1, 2

## WCAP-ATG8 13x20x5x0.6 860011378007
designator C?, comment 22 μF
WCAP-ATG8 Aluminum Electrolytic Capacitors , 22 μF; + / - 20%; 400 V , 13 x 20; Manufacturer: Wurth Elektronik; partNo: 860011378007; E-mail: libraries@we-online.com; Characteristics: Aluminum Electrolytic Capacitor; Recommended soldering: Wave; Operating temperature:–40 °C to +85 °C for UR < 400 V; 25 °C to +85 °C for UR ≥ 400 V; Wide capacitance value range; Load life: 2000 h @ +85 °C; ComponentLink1Description: Manufacturer; ComponentLink1URL: http://www.we-online.com; ComponentLink2Description: Datasheet; ComponentLink2URL: http://katalog.we-online.de/pbs/datasheet/860011378007.pdf; Created by: Karrer Zheng; Created Date: 6/8/2015; Capacitance: 22 μF; Application: Medium and high voltage type range from 160V-450V used as primary side input filter in power supply; Low voltage type used as energy storage or low frequency filtering in circuit, applied to general switching power supply, AC-DC converter, adapter, charger, TV, VCR, DC motor circuit filter, digital audio, digital cameras, digital video cameras, satellite receiver etc.
footprint WCAP-ATG8 13x20x5x0.6
pins: 1, 2

## WCAP-ATG8 13x25x5x0.6 860011378008
designator C?, comment 33 μF
WCAP-ATG8 Aluminum Electrolytic Capacitors , 33 μF; + / - 20%; 400 V , 13 x 25; Manufacturer: Wurth Elektronik; partNo: 860011378008; E-mail: libraries@we-online.com; Characteristics: Aluminum Electrolytic Capacitor; Recommended soldering: Wave; Operating temperature:–40 °C to +85 °C for UR < 400 V; 25 °C to +85 °C for UR ≥ 400 V; Wide capacitance value range; Load life: 2000 h @ +85 °C; ComponentLink1Description: Manufacturer; ComponentLink1URL: http://www.we-online.com; ComponentLink2Description: Datasheet; ComponentLink2URL: http://katalog.we-online.de/pbs/datasheet/860011378008.pdf; Created by: Karrer Zheng; Created Date: 6/8/2015; Capacitance: 33 μF; Application: Medium and high voltage type range from 160V-450V used as primary side input filter in power supply; Low voltage type used as energy storage or low frequency filtering in circuit, applied to general switching power supply, AC-DC converter, adapter, charger, TV, VCR, DC motor circuit filter, digital audio, digital cameras, digital video cameras, satellite receiver etc.
footprint WCAP-ATG8 13x25x5x0.6
pins: 1, 2

## WCAP-ATG8 16x25x7.5x0.8 860011380009
designator C?, comment 47 μF
WCAP-ATG8 Aluminum Electrolytic Capacitors , 47 μF; + / - 20%; 400 V , 16 x 25; Manufacturer: Wurth Elektronik; partNo: 860011380009; E-mail: libraries@we-online.com; Characteristics: Aluminum Electrolytic Capacitor; Recommended soldering: Wave; Operating temperature:–40 °C to +85 °C for UR < 400 V; 25 °C to +85 °C for UR ≥ 400 V; Wide capacitance value range; Load life: 2000 h @ +85 °C; ComponentLink1Description: Manufacturer; ComponentLink1URL: http://www.we-online.com; ComponentLink2Description: Datasheet; ComponentLink2URL: http://katalog.we-online.de/pbs/datasheet/860011380009.pdf; Created by: Karrer Zheng; Created Date: 6/8/2015; Capacitance: 47 μF; Application: Medium and high voltage type range from 160V-450V used as primary side input filter in power supply; Low voltage type used as energy storage or low frequency filtering in circuit, applied to general switching power supply, AC-DC converter, adapter, charger, TV, VCR, DC motor circuit filter, digital audio, digital cameras, digital video cameras, satellite receiver etc.
footprint WCAP-ATG8 16x25x7.5x0.8
pins: 1, 2

## WCAP-ATG8 16x35.5x7.5x0.8 860011380010
designator C?, comment 68 μF
WCAP-ATG8 Aluminum Electrolytic Capacitors , 68 μF; + / - 20%; 400 V , 16 x 35,5; Manufacturer: Wurth Elektronik; partNo: 860011380010; E-mail: libraries@we-online.com; Characteristics: Aluminum Electrolytic Capacitor; Recommended soldering: Wave; Operating temperature:–40 °C to +85 °C for UR < 400 V; 25 °C to +85 °C for UR ≥ 400 V; Wide capacitance value range; Load life: 2000 h @ +85 °C; ComponentLink1Description: Manufacturer; ComponentLink1URL: http://www.we-online.com; ComponentLink2Description: Datasheet; ComponentLink2URL: http://katalog.we-online.de/pbs/datasheet/860011380010.pdf; Created by: Karrer Zheng; Created Date: 6/8/2015; Capacitance: 68 μF; Application: Medium and high voltage type range from 160V-450V used as primary side input filter in power supply; Low voltage type used as energy storage or low frequency filtering in circuit, applied to general switching power supply, AC-DC converter, adapter, charger, TV, VCR, DC motor circuit filter, digital audio, digital cameras, digital video cameras, satellite receiver etc.
footprint WCAP-ATG8 16x35.5x7.5x0.8
pins: 1, 2

## WCAP-ATG8 18x25x7.5x0.8 860011381011
designator C?, comment 68 μF
WCAP-ATG8 Aluminum Electrolytic Capacitors , 68 μF; + / - 20%; 400 V , 18 x 25; Manufacturer: Wurth Elektronik; partNo: 860011381011; E-mail: libraries@we-online.com; Characteristics: Aluminum Electrolytic Capacitor; Recommended soldering: Wave; Operating temperature:–40 °C to +85 °C for UR < 400 V; 25 °C to +85 °C for UR ≥ 400 V; Wide capacitance value range; Load life: 2000 h @ +85 °C; ComponentLink1Description: Manufacturer; ComponentLink1URL: http://www.we-online.com; ComponentLink2Description: Datasheet; ComponentLink2URL: http://katalog.we-online.de/pbs/datasheet/860011381011.pdf; Created by: Karrer Zheng; Created Date: 6/8/2015; Capacitance: 68 μF; Application: Medium and high voltage type range from 160V-450V used as primary side input filter in power supply; Low voltage type used as energy storage or low frequency filtering in circuit, applied to general switching power supply, AC-DC converter, adapter, charger, TV, VCR, DC motor circuit filter, digital audio, digital cameras, digital video cameras, satellite receiver etc.
footprint WCAP-ATG8 18x25x7.5x0.8
pins: 1, 2

## WCAP-ATG8 18x31.5x7.5x0.8 860011381012
designator C?, comment 100 μF
WCAP-ATG8 Aluminum Electrolytic Capacitors , 100 μF; + / - 20%; 400 V , 18 x 31,5; Manufacturer: Wurth Elektronik; partNo: 860011381012; E-mail: libraries@we-online.com; Characteristics: Aluminum Electrolytic Capacitor; Recommended soldering: Wave; Operating temperature:–40 °C to +85 °C for UR < 400 V; 25 °C to +85 °C for UR ≥ 400 V; Wide capacitance value range; Load life: 2000 h @ +85 °C; ComponentLink1Description: Manufacturer; ComponentLink1URL: http://www.we-online.com; ComponentLink2Description: Datasheet; ComponentLink2URL: http://katalog.we-online.de/pbs/datasheet/860011381012.pdf; Created by: Karrer Zheng; Created Date: 6/8/2015; Capacitance: 100 μF; Application: Medium and high voltage type range from 160V-450V used as primary side input filter in power supply; Low voltage type used as energy storage or low frequency filtering in circuit, applied to general switching power supply, AC-DC converter, adapter, charger, TV, VCR, DC motor circuit filter, digital audio, digital cameras, digital video cameras, satellite receiver etc.
footprint WCAP-ATG8 18x31.5x7.5x0.8
pins: 1, 2

## WCAP-ATG8 18x41x7.5x0.8 860011381013
designator C?, comment 120 μF
WCAP-ATG8 Aluminum Electrolytic Capacitors , 120 μF; + / - 20%; 400 V , 18 x 41; Manufacturer: Wurth Elektronik; partNo: 860011381013; E-mail: libraries@we-online.com; Characteristics: Aluminum Electrolytic Capacitor; Recommended soldering: Wave; Operating temperature:–40 °C to +85 °C for UR < 400 V; 25 °C to +85 °C for UR ≥ 400 V; Wide capacitance value range; Load life: 2000 h @ +85 °C; ComponentLink1Description: Manufacturer; ComponentLink1URL: http://www.we-online.com; ComponentLink2Description: Datasheet; ComponentLink2URL: http://katalog.we-online.de/pbs/datasheet/860011381013.pdf; Created by: Karrer Zheng; Created Date: 6/8/2015; Capacitance: 120 μF; Application: Medium and high voltage type range from 160V-450V used as primary side input filter in power supply; Low voltage type used as energy storage or low frequency filtering in circuit, applied to general switching power supply, AC-DC converter, adapter, charger, TV, VCR, DC motor circuit filter, digital audio, digital cameras, digital video cameras, satellite receiver etc.
footprint WCAP-ATG8 18x41x7.5x0.8
pins: 1, 2